# Altium footprint library Integrated_Circuit.PcbLib: 85 footprints (part 5 of 6)
Each footprint in its own frame and in the unit in brackets; x right, y up, seen from the top. Pads: shape width x height; smd on the part's side, far side on the other; paste and mask are expansions set on the pad; w line width, h text height; cw(c..) or ccw(c..) is an arc to the next point about the centre after c.
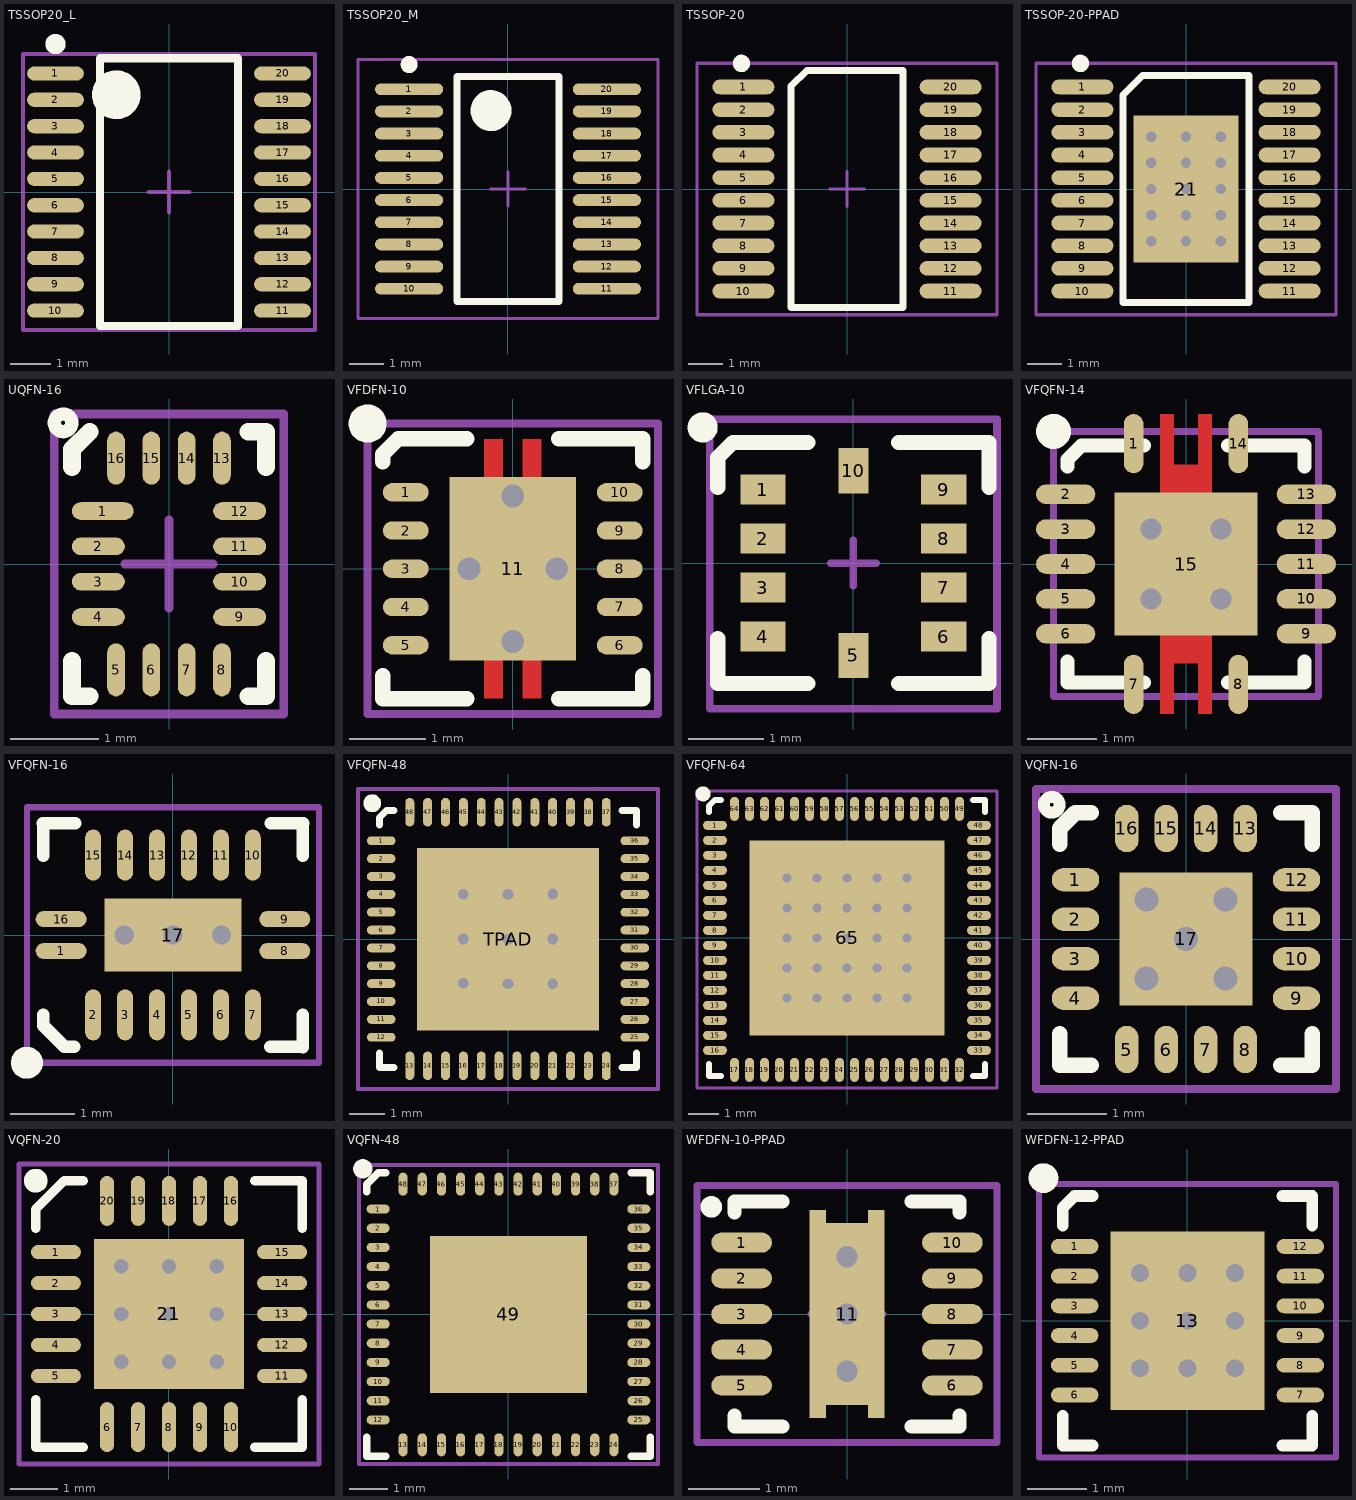
[diagram p4: the footprints below, top view; thin cyan lines are the x and y axes]

## TSSOP20_L [mm] "TSOP, 20-Leads, Body 6.5x4.4mm, Pitch 0.65mm, IPC High Density"
height 1.1
pads (20):
  oval 1.4x0.35 smd: 1(-2.8,2.925) 2(-2.8,2.275) 3(-2.8,1.625) 4(-2.8,0.975) 5(-2.8,0.325) 6(-2.8,-0.325) 7(-2.8,-0.975) 8(-2.8,-1.625) 9(-2.8,-2.275) 10(-2.8,-2.925) 11(2.8,-2.925) 12(2.8,-2.275) 13(2.8,-1.625) 14(2.8,-0.975) 15(2.8,-0.325) 16(2.8,0.325) 17(2.8,0.975) 18(2.8,1.625) 19(2.8,2.275) 20(2.8,2.925)
Top Overlay:
  circle w0.6: c-1.3,2.4 r0.3
  circle w0.25: c-2.8,3.65 r0.125
  lines w0.2: -1.7,-3.3 1.7,-3.3 1.7,3.3 -1.7,3.3 -1.7,-3.3
Mechanical 15:
  lines w0.1: -0.5,0 0.5,0 ; 0,-0.5 0,0.5 ; -3.6,-3.4 3.6,-3.4 3.6,3.4 -3.6,3.4 -3.6,-3.4
3D body "User Library-TSSOP-20.STEP": height 1.2, standoff 0, extent -3.275,-3.3 3.275,3.3

## TSSOP20_M [mm] "TSOP, 20-Leads, Body 6.5x4.4mm, Pitch 0.65mm, IPC Low Density"
height 1.1
pads (20):
  oval 2x0.35 smd: 1(-2.9,2.925) 2(-2.9,2.275) 3(-2.9,1.625) 4(-2.9,0.975) 5(-2.9,0.325) 6(-2.9,-0.325) 7(-2.9,-0.975) 8(-2.9,-1.625) 9(-2.9,-2.275) 10(-2.9,-2.925) 11(2.9,-2.925) 12(2.9,-2.275) 13(2.9,-1.625) 14(2.9,-0.975) 15(2.9,-0.325) 16(2.9,0.325) 17(2.9,0.975) 18(2.9,1.625) 19(2.9,2.275) 20(2.9,2.925)
Top Overlay:
  circle w0.25: c-2.9,3.65 r0.125
  circle w0.6: c-0.5,2.3 r0.3
  lines w0.2: -1.5,-3.3 -1.5,3.3 1.5,3.3 1.5,-3.3 -1.5,-3.3
Mechanical 15:
  lines w0.1: -0.5,0 0.5,0 ; 0,-0.5 0,0.5 ; -4.4,-3.8 -4.4,3.8 4.4,3.8 4.4,-3.8 -4.4,-3.8
3D body: height 1.1, standoff 0, extent -2.25,-3.3 2.25,3.3

## TSSOP-20 [mm]
pads (20):
  oval 1.78x0.42 smd: 1(-2.97,2.925) 2(-2.97,2.275) 3(-2.97,1.625) 4(-2.97,0.975) 5(-2.97,0.325) 6(-2.97,-0.325) 7(-2.97,-0.975) 8(-2.97,-1.625) 9(-2.97,-2.275) 10(-2.97,-2.925) 11(2.97,-2.925) 12(2.97,-2.275) 13(2.97,-1.625) 14(2.97,-0.975) 15(2.97,-0.325) 16(2.97,0.325) 17(2.97,0.975) 18(2.97,1.625) 19(2.97,2.275) 20(2.97,2.925)
Top Overlay:
  circle w0.25: c-3.025,3.6 r0.125
  lines w0.2: -1.6,2.9 -1.6,-3.4 1.6,-3.4 1.6,3.4 -1.15,3.4 -1.6,2.95
Mechanical 15:
  lines w0.1: -0.5,0 0.5,0 ; 0,-0.5 0,0.5 ; -4.3,-3.6 4.3,-3.6 4.3,3.6 -4.3,3.6 -4.3,-3.6
3D body "TSSOP-20.STEP": height 1, standoff 0, extent -3.205,-3.25 3.205,3.25

## TSSOP-20-PPAD [mm]
pads (21):
  oval 1.78x0.42 smd: 1(-2.97,2.925) 2(-2.97,2.275) 3(-2.97,1.625) 4(-2.97,0.975) 5(-2.97,0.325) 6(-2.97,-0.325) 7(-2.97,-0.975) 8(-2.97,-1.625) 9(-2.97,-2.275) 10(-2.97,-2.925) 11(2.97,-2.925) 12(2.97,-2.275) 13(2.97,-1.625) 14(2.97,-0.975) 15(2.97,-0.325) 16(2.97,0.325) 17(2.97,0.975) 18(2.97,1.625) 19(2.97,2.275) 20(2.97,2.925)
  rect 3x4.2 smd: 21(0,0)
via 1,-1.5 diameter 0.5 hole 0.3
via 1,-0.75 diameter 0.5 hole 0.3
via 0,-0.75 diameter 0.5 hole 0.3
via 0,-1.5 diameter 0.5 hole 0.3
via -1,-1.5 diameter 0.5 hole 0.3
via -1,-0.75 diameter 0.5 hole 0.3
via -1,1.5 diameter 0.5 hole 0.3
via -1,0.75 diameter 0.5 hole 0.3
via 1,0.75 diameter 0.5 hole 0.3
via 1,1.5 diameter 0.5 hole 0.3
via 0,1.5 diameter 0.5 hole 0.3
via 0,0.75 diameter 0.5 hole 0.3
via -1,0 diameter 0.5 hole 0.3
via 1,0 diameter 0.5 hole 0.3
via 0,0 diameter 0.5 hole 0.3
Top Overlay:
  circle w0.25: c-3.025,3.6 r0.125
  lines w0.2: -1.8,-3.25 1.8,-3.25 1.8,3.25 -1.25,3.25 -1.8,2.7 -1.8,-3.25
Mechanical 15:
  lines w0.1: -0.5,0 0.5,0 ; 0,-0.5 0,0.5 ; -4.3,-3.6 4.3,-3.6 4.3,3.6 -4.3,3.6 -4.3,-3.6
3D body "TSSOP-20.STEP": height 1, standoff 0, extent -3.205,-3.25 3.205,3.25

## UQFN-16 [mm]
height 0.5
pads (16):
  oval 0.7x0.2 smd: 1(-0.75,0.6)
  oval 0.6x0.2 smd: 2(-0.8,0.2) 3(-0.8,-0.2) 4(-0.8,-0.6) 9(0.8,-0.6) 10(0.8,-0.2) 11(0.8,0.2) 12(0.8,0.6)
  oval 0.2x0.6 smd: 5(-0.6,-1.2) 6(-0.2,-1.2) 7(0.2,-1.2) 8(0.6,-1.2) 13(0.6,1.2) 14(0.2,1.2) 15(-0.2,1.2) 16(-0.6,1.2)
Top Overlay:
  circle w0.15: c-1.2,1.6 r0.1
  lines w0.2: -1.1,-1.1 -1.1,-1.5 -0.9,-1.5 ; -1.1,1.1 -1.1,1.3 ; 0.9,-1.5 1.1,-1.5 1.1,-1.1 ; 0.9,1.5 1.1,1.5 1.1,1.1 ; -1.1,1.3 -1.1,1.3 ; -1.1,1.3 -0.9,1.5 ; -0.9,1.5 -0.9,1.5
Mechanical 15:
  lines w0.1: -0.5,0 0.5,0 ; 0,-0.5 0,0.5 ; -1.3,-1.7 -1.3,1.7 1.3,1.7 1.3,-1.7 -1.3,-1.7
3D body "User Library-UQFN-16.step": height -0.42, standoff -1.02, extent -0.934,-1.328 0.916,1.322

## VFDFN-10 [mm]
height 1
pads (11):
  oval 0.6x0.24 smd: 1(-1.4,1) 2(-1.4,0.5) 3(-1.4,0) 4(-1.4,-0.5) 5(-1.4,-1) 6(1.4,-1) 7(1.4,-0.5) 8(1.4,0) 9(1.4,0.5) 10(1.4,1)
  rect 1.65x2.4 smd: 11(0,0)
via 0.575,0 diameter 0.5 hole 0.3
via -0.575,0 diameter 0.5 hole 0.3
via 0,-0.95 diameter 0.5 hole 0.3
via 0,0.95 diameter 0.5 hole 0.3
Top Layer:
  rectangle: 0.125,-1.7 0.375,-1.1
  rectangle: -0.375,-1.7 -0.125,-1.1
  rectangle: 0.125,1.1 0.375,1.7
  rectangle: -0.375,1.1 -0.125,1.7
Top Overlay:
  circle w0.25: c-1.9,1.9 r0.125
  lines w0.2: -1.7,-1.4 -1.7,-1.7 -0.6,-1.7 ; -1.7,1.4 -1.7,1.5 -1.5,1.7 -0.6,1.7 ; 0.6,-1.7 1.7,-1.7 1.7,-1.4 ; 0.6,1.7 1.7,1.7 1.7,1.4
Mechanical 15:
  lines w0.1: -0.5,0 0.5,0 ; 0,-0.5 0,0.5 ; -1.9,-1.9 -1.9,1.9 1.9,1.9 1.9,-1.9 -1.9,-1.9
3D body "User Library-LM5166YDRC_VSON-DRC10.step": height 1, standoff 0, extent -1.56,-1.562 1.56,1.562

## VFLGA-10 [mm]
height 0.91
pads (10):
  rect 0.6x0.4 smd: 1(-1.2,0.975) 2(-1.2,0.325) 3(-1.2,-0.325) 4(-1.2,-0.975) 6(1.2,-0.975) 7(1.2,-0.325) 8(1.2,0.325) 9(1.2,0.975)
  rect 0.4x0.6 smd: 5(0,-1.225) 10(0,1.225)
Top Overlay:
  circle w0.25: c-2,1.8 r0.075
  lines w0.2: -1.8,-1.6 -0.6,-1.6 ; -1.8,-1.6 -1.8,-1 ; -1.8,1 -1.8,1.4 -1.6,1.6 -0.6,1.6 ; 0.6,-1.6 1.8,-1.6 1.8,-1 ; 0.6,1.6 1.8,1.6 1.8,1
Mechanical 15:
  lines w0.1: -0.3,0 0.3,0 ; 0,-0.3 0,0.3 ; -1.905,-1.93 1.905,-1.93 1.905,1.905 -1.905,1.905 -1.905,-1.93
3D body "VFLGA-10 3x3x0.9mm.STEP": height 0.95, standoff 0, extent -1.5,-1.5 1.5,1.5

## VFQFN-14 [mm]
height 1
pads (15):
  oval 0.28x0.85 smd: 1(-0.75,1.725) 7(-0.75,-1.725) 8(0.75,-1.725) 14(0.75,1.725)
  oval 0.85x0.28 smd: 2(-1.725,1) 3(-1.725,0.5) 4(-1.725,0) 5(-1.725,-0.5) 6(-1.725,-1) 9(1.725,-1) 10(1.725,-0.5) 11(1.725,0) 12(1.725,0.5) 13(1.725,1)
  rect 2.05x2.05 smd: 15(0,0)
via -0.5,0.5 diameter 0.5 hole 0.3
via 0.5,0.5 diameter 0.5 hole 0.3
via 0.5,-0.5 diameter 0.5 hole 0.3
via -0.5,-0.5 diameter 0.5 hole 0.3
Top Layer:
  rectangle: -0.375,0.9 -0.175,2.15
  rectangle: 0.175,0.9 0.375,2.15
  region: -0.175,-0.9 -0.375,-0.9 -0.375,-2.15 -0.175,-2.15
  region: 0.375,-0.9 0.175,-0.9 0.175,-2.15 0.375,-2.15
  rectangle: -0.3,0.9 0.3,1.425
  region: 0.3,-0.9 -0.3,-0.9 -0.3,-1.425 0.3,-1.425
Top Overlay:
  circle w0.25: c-1.9,1.9 r0.125
  lines w0.2: -1.7,-1.4 -1.7,-1.7 -0.6,-1.7 ; -1.7,1.4 -1.7,1.5 -1.5,1.7 -0.6,1.7 ; 0.6,-1.7 1.7,-1.7 1.7,-1.4 ; 0.6,1.7 1.7,1.7 1.7,1.4
Mechanical 15:
  lines w0.1: -0.5,0 0.5,0 ; 0,-0.5 0,0.5 ; -1.9,-1.9 1.9,-1.9 1.9,1.9 -1.9,1.9 -1.9,-1.9
3D body "RHL14_2P05X2P05.step": height 0.74, standoff 0, extent -1.876,-1.876 1.876,1.876

## VFQFN-16 [mm] "QFN, 16 Pin, 0.5mm Pitch"
height 0.2
pads (17):
  oval 0.8x0.25 smd: 1(-1.75,-0.25) 8(1.75,-0.25) 9(1.75,0.25) 16(-1.75,0.25)
  oval 0.25x0.8 smd: 2(-1.25,-1.25) 3(-0.75,-1.25) 4(-0.25,-1.25) 5(0.25,-1.25) 6(0.75,-1.25) 7(1.25,-1.25) 10(1.25,1.25) 11(0.75,1.25) 12(0.25,1.25) 13(-0.25,1.25) 14(-0.75,1.25) 15(-1.25,1.25)
  rect 2.15x1.15 smd: 17(0,0)
via -0.762,0 diameter 0.5 hole 0.3
via 0.762,0 diameter 0.5 hole 0.3
via 0,0 diameter 0.5 hole 0.3
Top Overlay:
  circle w0.25: c-2.286,-2 r0.125
  lines w0.2: -2.036,1.75 -1.536,1.75 ; -2.032,-1.254 -2.032,-1.4 -2.032,-1.418 -1.7,-1.75 -1.55,-1.75 ; -2.032,1.242 -2.032,1.742 ; 1.524,-1.75 2.024,-1.75 ; 1.536,1.75 2.036,1.75 ; 2.032,-1.754 2.032,-1.254 ; 2.032,1.242 2.032,1.742
Mechanical 15:
  lines w0.1: -0.492,0 0.508,0 ; 0,-0.5 0,0.5 ; -2.286,-2 -2.286,2 2.286,2 2.286,-2 -2.286,-2
3D body "DHVQFN 16.STEP": height 1.05, standoff 0, extent -1.81,-1.31 1.81,1.31

## VFQFN-48 [mm] "QFN, 48 Pin, 0.5mm Pitch"
height 0.85
pads (49):
  oval 0.8x0.25 smd: 1(-3.55,2.75) 2(-3.55,2.25) 3(-3.55,1.75) 4(-3.55,1.25) 5(-3.55,0.75) 6(-3.55,0.25) 7(-3.55,-0.25) 8(-3.55,-0.75) 9(-3.55,-1.25) 10(-3.55,-1.75) 11(-3.55,-2.25) 12(-3.55,-2.75) 25(3.55,-2.75) 26(3.55,-2.25) 27(3.55,-1.75) 28(3.55,-1.25) 29(3.55,-0.75) 30(3.55,-0.25) 31(3.55,0.25) 32(3.55,0.75) 33(3.55,1.25) 34(3.55,1.75) 35(3.55,2.25) 36(3.55,2.75)
  oval 0.25x0.8 smd: 13(-2.75,-3.55) 14(-2.25,-3.55) 15(-1.75,-3.55) 16(-1.25,-3.55) 17(-0.75,-3.55) 18(-0.25,-3.55) 19(0.25,-3.55) 20(0.75,-3.55) 21(1.25,-3.55) 22(1.75,-3.55) 23(2.25,-3.55) 24(2.75,-3.55) 37(2.75,3.55) 38(2.25,3.55) 39(1.75,3.55) 40(1.25,3.55) 41(0.75,3.55) 42(0.25,3.55) 43(-0.25,3.55) 44(-0.75,3.55) 45(-1.25,3.55) 46(-1.75,3.55) 47(-2.25,3.55) 48(-2.75,3.55)
  rect 5.1x5.1 smd: TPAD(0,-0.008)
via 1.25,1.258 diameter 0.5 hole 0.3
via -1.25,-1.242 diameter 0.5 hole 0.3
via 1.25,0 diameter 0.5 hole 0.3
via 1.25,-1.25 diameter 0.5 hole 0.3
via 0,-1.25 diameter 0.5 hole 0.3
via 0,1.25 diameter 0.5 hole 0.3
via -1.25,1.25 diameter 0.5 hole 0.3
via -1.25,0 diameter 0.5 hole 0.3
via 0,-0.008 diameter 0.5 hole 0.3
Top Overlay:
  circle w0.25: c-3.8,3.8 r0.125
  lines w0.2: -3.6,-3.2 -3.6,-3.6 -3.2,-3.6 ; -3.6,3.2 -3.6,3.4 -3.4,3.6 -3.2,3.6 ; 3.2,-3.6 3.6,-3.6 3.6,-3.2 ; 3.2,3.6 3.6,3.6 3.6,3.2
Mechanical 15:
  lines w0.1: -0.5,0 0.5,0 ; 0,-0.508 0,0.492 ; -4.2,-4.2 -4.2,4.2 4.2,4.2 4.2,-4.2 -4.2,-4.2
3D body "ALSRobot-QFN48 7x7.step": height 0.78, standoff -0.02, extent -3.51,-3.51 3.51,3.51

## VFQFN-64 [mm] "QFN, 64 Pin, 0.5mm Pitch"
height 0.9
pads (65):
  oval 0.8x0.3 smd: 1(-4.4,3.75) 2(-4.4,3.25) 3(-4.4,2.75) 4(-4.4,2.25) 5(-4.4,1.75) 6(-4.4,1.25) 7(-4.4,0.75) 8(-4.4,0.25) 9(-4.4,-0.25) 10(-4.4,-0.75) 11(-4.4,-1.25) 12(-4.4,-1.75) 13(-4.4,-2.25) 14(-4.4,-2.75) 15(-4.4,-3.25) 16(-4.4,-3.75) 33(4.4,-3.75) 34(4.4,-3.25) 35(4.4,-2.75) 36(4.4,-2.25) 37(4.4,-1.75) 38(4.4,-1.25) 39(4.4,-0.75) 40(4.4,-0.25) 41(4.4,0.25) 42(4.4,0.75) 43(4.4,1.25) 44(4.4,1.75) 45(4.4,2.25) 46(4.4,2.75) 47(4.4,3.25) 48(4.4,3.75)
  oval 0.3x0.8 smd: 17(-3.75,-4.4) 18(-3.25,-4.4) 19(-2.75,-4.4) 20(-2.25,-4.4) 21(-1.75,-4.4) 22(-1.25,-4.4) 23(-0.75,-4.4) 24(-0.25,-4.4) 25(0.25,-4.4) 26(0.75,-4.4) 27(1.25,-4.4) 28(1.75,-4.4) 29(2.25,-4.4) 30(2.75,-4.4) 31(3.25,-4.4) 32(3.75,-4.4) 49(3.75,4.3) 50(3.25,4.3) 51(2.75,4.3) 52(2.25,4.3) 53(1.75,4.3) 54(1.25,4.3) 55(0.75,4.3) 56(0.25,4.3) 57(-0.25,4.3) 58(-0.75,4.3) 59(-1.25,4.3) 60(-1.75,4.3) 61(-2.25,4.3) 62(-2.75,4.3) 63(-3.25,4.3) 64(-3.75,4.3)
  rect 6.5x6.5 smd: 65(0,0)
via 2,-1 diameter 0.5 hole 0.3
via 2,-2 diameter 0.5 hole 0.3
via 1,-2 diameter 0.5 hole 0.3
via 1,-1 diameter 0.5 hole 0.3
via 0,-1 diameter 0.5 hole 0.3
via -1,-1 diameter 0.5 hole 0.3
via -2,-1 diameter 0.5 hole 0.3
via -2,-2 diameter 0.5 hole 0.3
via -1,-2 diameter 0.5 hole 0.3
via 0,-2 diameter 0.5 hole 0.3
via -1,0 diameter 0.5 hole 0.3
via -1,1 diameter 0.5 hole 0.3
via -1,2 diameter 0.5 hole 0.3
via -2,2 diameter 0.5 hole 0.3
via -2,1 diameter 0.5 hole 0.3
via -2,0 diameter 0.5 hole 0.3
via 0,2 diameter 0.5 hole 0.3
via 1,2 diameter 0.5 hole 0.3
via 2,2 diameter 0.5 hole 0.3
via 2,1 diameter 0.5 hole 0.3
via 1,1 diameter 0.5 hole 0.3
via 0,1 diameter 0.5 hole 0.3
via 2,0 diameter 0.5 hole 0.3
via 1,0 diameter 0.5 hole 0.3
via 0,0 diameter 0.5 hole 0.3
Top Overlay:
  circle w0.25: c-4.8,4.8 r0.125
  lines w0.2: -4.6,-4.2 -4.6,-4.6 -4.2,-4.6 ; -4.6,4.2 -4.6,4.4 -4.4,4.6 -4.2,4.6 ; 4.2,-4.6 4.6,-4.6 4.6,-4.2 ; 4.2,4.6 4.6,4.6 4.6,4.2
Mechanical 15:
  lines w0.1: -0.5,0 0.5,0 ; 0,-0.508 0,0.492 ; -5,-5 5,-5 5,4.9 -5,4.9 -5,-5
3D body "User Library-QFN64-2.step": height 0.9, standoff 0, extent -4.52,-4.52 4.52,4.52

## VQFN-16 [mm] "16-Pin Plastic Quad Flat No-Lead 0.5 mm Pitch"
height 1
pads (17):
  oval 0.6x0.3 smd: 1(-1.4,0.75) 2(-1.4,0.25) 3(-1.4,-0.25) 4(-1.4,-0.75) 9(1.4,-0.75) 10(1.4,-0.25) 11(1.4,0.25) 12(1.4,0.75)
  oval 0.3x0.6 smd: 5(-0.75,-1.4) 6(-0.25,-1.4) 7(0.25,-1.4) 8(0.75,-1.4) 13(0.75,1.4) 14(0.25,1.4) 15(-0.25,1.4) 16(-0.75,1.4)
  rect 1.68x1.68 smd: 17(0,0)
via 0,0 diameter 0.5 hole 0.3
via 0.5,0.5 diameter 0.5 hole 0.3
via -0.5,0.5 diameter 0.5 hole 0.3
via -0.5,-0.5 diameter 0.5 hole 0.3
via 0.5,-0.5 diameter 0.5 hole 0.3
Top Overlay:
  circle w0.15: c-1.7,1.7 r0.1
  lines w0.2: -1.6,-1.2 -1.6,-1.6 -1.2,-1.6 ; -1.6,1.2 -1.6,1.402 -1.402,1.6 -1.2,1.6 ; 1.2,-1.6 1.6,-1.6 1.6,-1.2 ; 1.2,1.6 1.6,1.6 ; 1.6,1.2 1.6,1.6
Mechanical 15:
  lines w0.1: -0.5,0 0.5,0 ; 0,-0.5 0,0.5 ; -1.9,-1.9 -1.9,1.9 1.9,1.9 1.9,-1.9 -1.9,-1.9
3D body "User Library-QFN-16.step": height 0.9, standoff 0, extent -1.501,-1.501 1.501,1.501

## VQFN-20 [mm] "20-Pin Plastic Quad Flat No-Lead 0.65 mm Pitch"
height 1
pads (21):
  oval 1.05x0.3 smd: 1(-2.375,1.3) 2(-2.375,0.65) 3(-2.375,0) 4(-2.375,-0.65) 5(-2.375,-1.3) 11(2.375,-1.3) 12(2.375,-0.65) 13(2.375,0) 14(2.375,0.65) 15(2.375,1.3)
  oval 0.3x1.05 smd: 6(-1.3,-2.375) 7(-0.65,-2.375) 8(0,-2.375) 9(0.65,-2.375) 10(1.3,-2.375) 16(1.3,2.375) 17(0.65,2.375) 18(0,2.375) 19(-0.65,2.375) 20(-1.3,2.375)
  rect 3.15x3.15 smd: 21(0,0)
via 1,1 diameter 0.6 hole 0.3
via -1,1 diameter 0.6 hole 0.3
via 0,1 diameter 0.6 hole 0.3
via 0,0 diameter 0.6 hole 0.3
via 1,0 diameter 0.6 hole 0.3
via -1,0 diameter 0.6 hole 0.3
via -1,-1 diameter 0.6 hole 0.3
via 1,-1 diameter 0.6 hole 0.3
via 0,-1 diameter 0.6 hole 0.3
Top Overlay:
  circle w0.25: c-2.8,2.8 r0.125
  lines w0.2: -2.8,-1.8 -2.8,-2.8 -1.8,-2.8 ; -2.8,1.8 -2.8,2.2 -2.2,2.8 -1.8,2.8 ; 1.8,-2.8 2.8,-2.8 2.8,-1.8 ; 1.8,2.8 2.8,2.8 2.8,1.8
Mechanical 15:
  lines w0.1: -0.5,0 0.5,0 ; 0,-0.5 0,0.5 ; -3.15,-3.15 -3.15,3.15 3.15,3.15 3.15,-3.15 -3.15,-3.15
3D body "VQFN-20.STEP": height 1.05, standoff 0, extent -2.625,-2.625 2.625,2.625

## VQFN-48 [mm]
height 1
pads (49):
  oval 0.6x0.24 smd: 1(-3.4,2.75) 2(-3.4,2.25) 3(-3.4,1.75) 4(-3.4,1.25) 5(-3.4,0.75) 6(-3.4,0.25) 7(-3.4,-0.25) 8(-3.4,-0.75) 9(-3.4,-1.25) 10(-3.4,-1.75) 11(-3.4,-2.25) 12(-3.4,-2.75) 25(3.4,-2.75) 26(3.4,-2.25) 27(3.4,-1.75) 28(3.4,-1.25) 29(3.4,-0.75) 30(3.4,-0.25) 31(3.4,0.25) 32(3.4,0.75) 33(3.4,1.25) 34(3.4,1.75) 35(3.4,2.25) 36(3.4,2.75)
  oval 0.24x0.6 smd: 13(-2.75,-3.4) 14(-2.25,-3.4) 15(-1.75,-3.4) 16(-1.25,-3.4) 17(-0.75,-3.4) 18(-0.25,-3.4) 19(0.25,-3.4) 20(0.75,-3.4) 21(1.25,-3.4) 22(1.75,-3.4) 23(2.25,-3.4) 24(2.75,-3.4) 37(2.75,3.4) 38(2.25,3.4) 39(1.75,3.4) 40(1.25,3.4) 41(0.75,3.4) 42(0.25,3.4) 43(-0.25,3.4) 44(-0.75,3.4) 45(-1.25,3.4) 46(-1.75,3.4) 47(-2.25,3.4) 48(-2.75,3.4)
  rect 4.1x4.1 smd: 49(0,0)
Top Overlay:
  circle w0.25: c-3.8,3.8 r0.125
  lines w0.2: -3.7,-3.2 -3.7,-3.7 -3.2,-3.7 ; -3.7,3.2 -3.7,3.4 -3.4,3.7 -3.2,3.7 ; 3.2,-3.7 3.7,-3.7 3.7,-3.2 ; 3.2,3.7 3.7,3.7 3.7,3.2
Mechanical 15:
  lines w0.1: -0.5,0 0.5,0 ; 0,-0.5 0,0.5 ; -3.9,-3.9 -3.9,3.9 3.9,3.9 3.9,-3.9 -3.9,-3.9
3D body "User Library-QFN48-RGZ.step": height 1, standoff 0, extent -3.502,-3.5 3.5,3.502

## WFDFN-10-PPAD [mm]
height 0.8
pads (13):
  oval 0.85x0.28 smd: 1(-1.475,1) 2(-1.475,0.5) 3(-1.475,0) 4(-1.475,-0.5) 5(-1.475,-1) 6(1.475,-1) 7(1.475,-0.5) 8(1.475,0) 9(1.475,0.5) 10(1.475,1)
  rect 1.05x2.55 smd: 11(0,0)
  rect 0.23x2.91 smd: ""(-0.41,0) ""(0.41,0)
via 0,0.8 diameter 0.5 hole 0.3
via 0,-0.8 diameter 0.5 hole 0.3
via 0,0 diameter 0.5 hole 0.3
Top Overlay:
  circle w0.2: c-1.9,1.5 r0.05
  lines w0.2: -1.575,-1.425 -1.575,-1.575 -0.907,-1.575 ; -1.575,1.425 -1.575,1.575 -0.907,1.575 ; 0.907,-1.575 1.575,-1.575 1.575,-1.425 ; 0.907,1.575 1.575,1.575 1.575,1.425
Mechanical 15:
  lines w0.1: -0.5,0 0.5,0 ; 0,-0.5 0,0.5 ; -2.1,-1.8 2.1,-1.8 2.1,1.8 -2.1,1.8 -2.1,-1.8
3D body "WSON-10.STEP": height 0.7, standoff 0, extent -1.5,-1.5 1.5,1.5

## WFDFN-12-PPAD [mm]
height 0.8
pads (13):
  oval 0.8x0.25 smd: 1(-1.9,1.25) 2(-1.9,0.75) 3(-1.9,0.25) 4(-1.9,-0.25) 5(-1.9,-0.75) 6(-1.9,-1.25) 7(1.9,-1.25) 8(1.9,-0.75) 9(1.9,-0.25) 10(1.9,0.25) 11(1.9,0.75) 12(1.9,1.25)
  rect 2.6x3 smd: 13(0,0)
via 0,0 diameter 0.5 hole 0.3
via 0,0.8 diameter 0.5 hole 0.3
via -0.8,0 diameter 0.5 hole 0.3
via 0,-0.8 diameter 0.5 hole 0.3
via 0.8,0 diameter 0.5 hole 0.3
via 0.8,0.8 diameter 0.5 hole 0.3
via 0.8,-0.8 diameter 0.5 hole 0.3
via -0.8,-0.8 diameter 0.5 hole 0.3
via -0.8,0.8 diameter 0.5 hole 0.3
Top Overlay:
  circle w0.25: c-2.425,2.4 r0.125
  lines w0.2: -2.1,-1.6 -2.1,-2.1 -1.6,-2.1 ; -2.1,1.6 -2.1,1.9 ; -1.6,2.1 -1.9,2.1 -1.9,2.1 -2.1,1.9 ; 1.6,-2.1 2.1,-2.1 2.1,-1.6 ; 1.6,2.1 2.1,2.1 2.1,1.6 ; -2.1,1.9 -2.1,1.9
Mechanical 15:
  lines w0.1: -0.5,0 0.5,0 ; 0,-0.5 0,0.5 ; -2.5,-2.3 2.5,-2.3 2.5,2.3 -2.5,2.3 -2.5,-2.3
3D body "LP39798-2.STEP": height 0.8, standoff 0, extent -2,-2 2,2